# Altium footprint library eLIB.PcbLib: 206 footprints (part 13 of 13)
Each footprint in its own frame and in the unit in brackets; x right, y up, seen from the top. Pads: shape width x height; smd on the part's side, far side on the other; paste and mask are expansions set on the pad; w line width, h text height; cw(c..) or ccw(c..) is an arc to the next point about the centre after c.
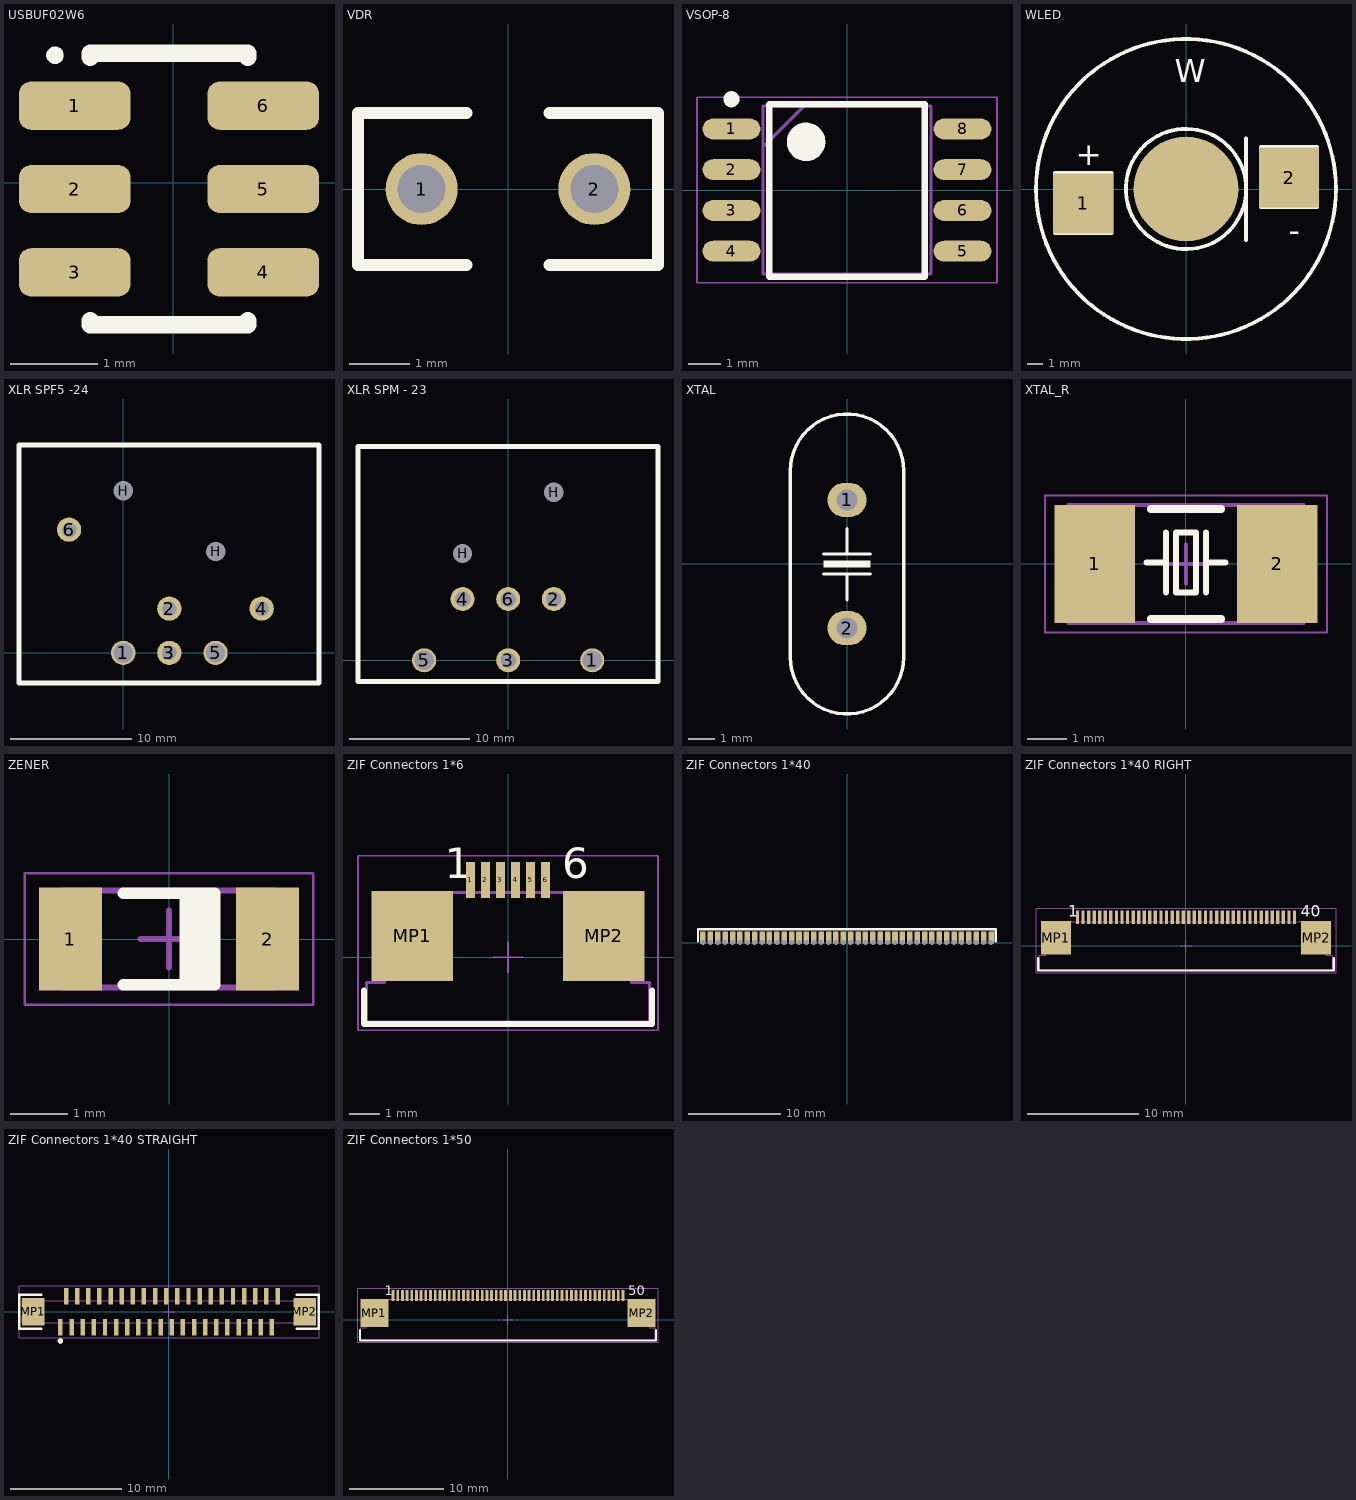
[diagram p12: the footprints below, top view; thin cyan lines are the x and y axes]

## USBUF02W6 [mm]
pads (6):
  rrect50% 1.27x0.55 smd paste+0.038 mask+0.038: 1(-1.124,0.877) 2(-1.124,-0.073) 3(-1.124,-1.023) 4(1.026,-1.023) 5(1.026,-0.073) 6(1.026,0.877)
Top Overlay:
  circle w0.1: c-1.349,1.452 r0.05
  lines w0.2: -0.949,-1.573 -0.949,-1.623 0.851,-1.623 0.851,-1.573 ; -0.949,1.427 -0.949,1.477 0.851,1.477 0.851,1.427
3D body "User Library-SOT23-6-2.STEP": height 1.45, standoff 0, extent -1.449,-1.523 1.351,1.377

## VDR [mm] "voltage depended resistor"
pads (2):
  round 1.2 hole 0.8: 1(-1.44,0) 2(1.44,0)
Top Overlay:
  lines w0.2: -0.692,-1.27 -2.5,-1.27 -2.5,1.27 -0.692,1.27 ; 0.692,-1.27 2.5,-1.27 2.5,1.27 0.692,1.27

## VSOP-8 [mm] "128Mbit NOR flash SPI"
pads (8):
  oval 1.8x0.65 smd: 1(-3.6,1.905) 2(-3.6,0.635) 3(-3.6,-0.635) 4(-3.6,-1.905) 5(3.6,-1.905) 6(3.6,-0.635) 7(3.6,0.635) 8(3.6,1.905)
Top Overlay:
  circle w0.25: c-3.6,2.83 r0.125
  circle w0.6: c-1.275,1.5 r0.3
  lines w0.2: -2.425,-2.7 -2.425,2.67 2.425,2.67 2.425,-2.7 -2.425,-2.7
Mechanical 13:
  lines w0.1: -2.615,1.345 -1.345,2.615 ; -2.615,-2.615 -2.615,2.615 2.615,2.615 2.615,-2.615 -2.615,-2.615
Mechanical 15:
  lines w0.05: -4.675,-2.89 -4.675,2.89 4.675,2.89 4.675,-2.89 -4.675,-2.89
3D body "User Library-W25Q128.STEP": height 1.9, standoff 0, extent -4.047,-2.745 4.087,2.745

## WLED [mm]
pads (3):
  rect 4x4 smd: 1(-6.858,-0.965) 2(6.883,0.762)
  round 7 smd: ""(0,0)
Top Overlay:
  circle w0.254: c0,0 r10.008
  circle w0.254: c0,0 r4.013
  lines w0.254: 4.013,-3.404 4.013,3.383 ; -8.738,-2.946 -4.978,-2.946 -4.978,1.067 -8.738,1.067 -8.738,-2.946 ; 5.004,-1.219 8.763,-1.219 8.763,2.794 5.004,2.794 5.004,-1.219
  text "W" at -0.762,7.112 h1.52
  text "+" at -7.366,1.575 h1.52
  text "-" at 6.858,-3.505 h1.52
3D body "SW3dPS-Power LED2.STEP": height 5.55, standoff 0, extent -7.23,-4.05 7.27,3.95

## XLR SPF5 -24 [mm] "ZWEE female 5 pole XLR"
pads (9):
  round 2 hole 1.6: 1(0,0) 5(7.6,0)
  round 2 hole 1.2: 2(3.8,3.65) 3(3.8,0) 3(3.8,0) 4(11.4,3.65) 6(-4.46,10.15)
  round 1.5 hole 1.6: H(0,13.35) H(7.62,8.35)
Top Overlay:
  lines w0.4: -8.58,-2.48 -8.58,17.12 16.12,17.12 16.12,-2.48 -8.58,-2.48

## XLR SPM - 23 [mm] "ZWEE male 5 pole XLR"
pads (8):
  round 2 hole 1.6: 1(7,0) 5(-7,0)
  round 2 hole 1.3: 2(3.8,5.1) 3(0,0) 4(-3.8,5.1) 6(0,5.1)
  round 1.5 hole 1.6: H(-3.8,8.9) H(3.8,14)
Top Overlay:
  lines w0.4: -12.51,-1.78 -12.51,17.82 12.48,17.82 12.48,-1.78 -12.51,-1.78

## XTAL [mm]
pads (2):
  oval 1.5x1.3 hole 0.8: 1(0,2.44) 2(0,-2.44)
Top Overlay:
  region: -0.889,0.127 -0.889,-0.127 0.889,-0.127 0.889,0.127
  lines w0.127: -0.889,-0.381 0.889,-0.381 ; -0.889,0.381 0.889,0.381 ; 0,-1.372 0,-0.381 ; 0,0.381 0,1.346 ; -2.159,-3.556 ccw(c0,-3.556) 2.159,-3.556 2.159,3.556 ccw(c0,3.556) -2.159,3.556 -2.159,-3.556
3D body "Crystal-3.8mm.STEP": height 3.56, standoff -2, extent -2.25,-5.75 2.25,5.75

## XTAL_R [mm]
pads (2):
  rect 2.05x3 smd: 1(-2.325,0) 2(2.325,0)
Top Overlay:
  lines w0.152: -1.008,0.039 -0.508,0.039 ; -0.508,-0.723 -0.508,0.801 ; 0.508,-0.723 0.508,0.801 ; 0.508,0.039 1.008,0.039 ; -0.25,-0.723 -0.25,0.801 0.25,0.801 0.25,-0.723 -0.25,-0.723
  lines w0.2: -0.9,-1.4 0.9,-1.4 ; -0.9,1.4 0.9,1.4
Mechanical 13:
  lines w0.1: -3,-1.5 -3,1.5 3,1.5 3,-1.5 -3,-1.5
Mechanical 15:
  lines w0.05: -3.6,-1.75 -3.6,1.75 3.6,1.75 3.6,-1.75 -3.6,-1.75
  lines w0.1: -0.5,0 0.5,0 ; 0,-0.5 0,0.5
3D body: height 1.1, standoff 0, extent -1.9,-1.5 1.9,1.5
3D body: height 1.1, standoff 0, extent -3,-1.5 -1.9,1.5
3D body: height 1.1, standoff 0, extent 1.9,-1.5 3,1.5

## ZENER [mm] "MELF Diode, 2-Leads, Body 3.50x1.47mm, IPC Medium Density"
height 1.7
pads (2):
  rect 1.1x1.8 smd: 1(-1.725,0) 2(1.725,0)
Top Overlay:
  rectangle: 0.18,-0.87 0.73,0.73
  lines w0.2: -0.8,-0.8 0.8,-0.8 0.8,0.8 -0.8,0.8
Mechanical 13:
  lines w0.1: -1.855,-0.85 -1.855,0.85 1.855,0.85 1.855,-0.85 -1.855,-0.85
Mechanical 15:
  lines w0.05: -2.525,-1.15 -2.525,1.15 2.525,1.15 2.525,-1.15 -2.525,-1.15
  lines w0.1: -0.5,0 0.5,0 ; 0,-0.5 0,0.5
3D body: height 1.69, standoff 0, extent -1.855,-0.85 -1.485,0.847
3D body: height 1.68, standoff 0.04, extent -0.885,-0.821 -0.285,0.818
3D body: height 1.68, standoff 0.04, extent -1.485,-0.82 1.485,0.817
3D body: height 1.69, standoff 0, extent 1.485,-0.85 1.855,0.847

## ZIF Connectors 1*6 [mm] "ZIF Connectors, Horizontal, Top Contact, pitch 0.5mm, 6p"
height 2.25
pads (8):
  rect 0.3x1.2 smd: 1(-1.25,2.56) 2(-0.75,2.56) 3(-0.25,2.56) 4(0.25,2.56) 5(0.75,2.56) 6(1.25,2.56)
  rect 2.7x3 smd: MP1(-3.18,0.7) MP2(3.18,0.7)
Top Overlay:
  lines w0.2: -4.775,-1.1 -4.775,-2.225 4.775,-2.225 4.775,-1.1
  text "1" at -2.1,2.61 h1.02
  text "6" at 1.8,2.61 h1.02
Mechanical 13:
  lines w0.1: -4.7,-2.15 4.7,-2.15 4.7,-0.85 4.1,-0.85 4.1,2.15 -4.1,2.15 -4.1,-0.85 -4.7,-0.85 -4.7,-2.15
Mechanical 15:
  lines w0.05: -0.5,0 0.5,0 ; 0,-0.5 0,0.5 ; -4.975,-2.425 4.975,-2.425 4.975,3.36 -4.975,3.36 -4.975,-2.425
3D body "68710614022.stp": height 2.1, standoff 0, extent -4.7,-2.15 4.7,2.95

## ZIF Connectors 1*40 [mm]
pads (40):
  rect 0.6x1.3 hole 0.55 copper offset 0,0.55: 1(-15.642,0) 2(-14.84,0) 3(-14.038,0) 4(-13.236,0) 5(-12.434,0) 6(-11.632,0) 7(-10.829,0) 8(-10.027,0) 9(-9.225,0) 10(-8.423,0) 11(-7.621,0) 12(-6.819,0) 13(-6.016,0) 14(-5.214,0) 15(-4.412,0) 16(-3.61,0) 17(-2.808,0) 18(-2.005,0) 19(-1.203,0) 20(-0.401,0) 21(0.401,0) 22(1.203,0) 23(2.005,0) 24(2.808,0) 25(3.61,0) 26(4.412,0) 27(5.214,0) 28(6.016,0) 29(6.819,0) 30(7.621,0) 31(8.423,0) 32(9.225,0) 33(10.027,0) 34(10.829,0) 35(11.632,0) 36(12.434,0) 37(13.236,0) 38(14.038,0) 39(14.84,0) 40(15.642,0)
Top Overlay:
  lines w0.254: -16.178,0.13 -16.178,1.44 15.97,1.44 16.17,1.44 16.17,0.13

## ZIF Connectors 1*40 RIGHT [mm] "ZIF Connectors, Horizontal, Bottom Contact, pitch 0.5mm, 40p"
height 2.25
pads (42):
  rect 0.3x1.2 smd: 1(-9.75,2.56) 2(-9.25,2.56) 3(-8.75,2.56) 4(-8.25,2.56) 5(-7.75,2.56) 6(-7.25,2.56) 7(-6.75,2.56) 8(-6.25,2.56) 9(-5.75,2.56) 10(-5.25,2.56) 11(-4.75,2.56) 12(-4.25,2.56) 13(-3.75,2.56) 14(-3.25,2.56) 15(-2.75,2.56) 16(-2.25,2.56) 17(-1.75,2.56) 18(-1.25,2.56) 19(-0.75,2.56) 20(-0.25,2.56) 21(0.25,2.56) 22(0.75,2.56) 23(1.25,2.56) 24(1.75,2.56) 25(2.25,2.56) 26(2.75,2.56) 27(3.25,2.56) 28(3.75,2.56) 29(4.25,2.56) 30(4.75,2.56) 31(5.25,2.56) 32(5.75,2.56) 33(6.25,2.56) 34(6.75,2.56) 35(7.25,2.56) 36(7.75,2.56) 37(8.25,2.56) 38(8.75,2.56) 39(9.25,2.56) 40(9.75,2.56)
  rect 2.7x3 smd: MP1(-11.68,0.7) MP2(11.68,0.7)
Top Overlay:
  lines w0.2: -13.275,-1.125 -13.275,-2.225 13.275,-2.225 13.275,-1.125
  text "1" at -10.6,2.61 h1.02
  text "40" at 10.3,2.61 h1.02
Mechanical 13:
  lines w0.1: -13.2,-2.15 -13.2,-0.85 -12.6,-0.85 -12.6,2.15 12.6,2.15 12.6,-0.85 13.2,-0.85 13.2,-2.15 -13.2,-2.15
Mechanical 15:
  lines w0.05: -0.5,0 0.5,0 ; 0,-0.5 0,0.5 ; -13.475,-2.425 13.475,-2.425 13.475,3.36 -13.475,3.36 -13.475,-2.425
3D body "68714014522.stp": height 2.1, standoff 0, extent -13.2,-2.15 13.2,2.95

## ZIF Connectors 1*40 STRAIGHT [mm] "PFC Connectors, Vertical, pitch 0.5mm, 40p"
height 4.5
pads (42):
  rect 0.4x1.5 smd: 1(-9.75,-1.4) 2(-9.25,1.4) 3(-8.75,-1.4) 4(-8.25,1.4) 5(-7.75,-1.4) 6(-7.25,1.4) 7(-6.75,-1.4) 8(-6.25,1.4) 9(-5.75,-1.4) 10(-5.25,1.4) 11(-4.75,-1.4) 12(-4.25,1.4) 13(-3.75,-1.4) 14(-3.25,1.4) 15(-2.75,-1.4) 16(-2.25,1.4) 17(-1.75,-1.4) 18(-1.25,1.4) 19(-0.75,-1.4) 20(-0.25,1.4) 21(0.25,-1.4) 22(0.75,1.4) 23(1.25,-1.4) 24(1.75,1.4) 25(2.25,-1.4) 26(2.75,1.4) 27(3.25,-1.4) 28(3.75,1.4) 29(4.25,-1.4) 30(4.75,1.4) 31(5.25,-1.4) 32(5.75,1.4) 33(6.25,-1.4) 34(6.75,1.4) 35(7.25,-1.4) 36(7.75,1.4) 37(8.25,-1.4) 38(8.75,1.4) 39(9.25,-1.4) 40(9.75,1.4)
  rect 2x2.5 smd: MP1(-12.192,0) MP2(12.192,0)
Top Overlay:
  circle w0.25: c-9.75,-2.625 r0.125
  lines w0.2: -11.45,-1.524 -13.462,-1.524 -13.462,1.524 -11.45,1.524 ; 11.45,-1.524 13.462,-1.524 13.462,1.524 11.45,1.524
Mechanical 13:
  lines w0.1: -13.2,-1 -13.2,1 13.2,1 13.2,-1 -13.2,-1
Mechanical 15:
  lines w0.05: -0.5,0 0.5,0 ; 0,-0.5 0,0.5 ; -13.475,-2.35 -13.475,2.35 13.475,2.35 13.475,-2.35 -13.475,-2.35
3D body "687340124422.stp": height 4.92, standoff 0.02, extent -13.2,-1.75 13.2,1.75

## ZIF Connectors 1*50 [mm] "ZIF Connectors, Horizontal, Top Contact, pitch 0.5mm, 50p"
height 2.25
pads (52):
  rect 0.3x1.2 smd: 1(-12.25,2.56) 2(-11.75,2.56) 3(-11.25,2.56) 4(-10.75,2.56) 5(-10.25,2.56) 6(-9.75,2.56) 7(-9.25,2.56) 8(-8.75,2.56) 9(-8.25,2.56) 10(-7.75,2.56) 11(-7.25,2.56) 12(-6.75,2.56) 13(-6.25,2.56) 14(-5.75,2.56) 15(-5.25,2.56) 16(-4.75,2.56) 17(-4.25,2.56) 18(-3.75,2.56) 19(-3.25,2.56) 20(-2.75,2.56) 21(-2.25,2.56) 22(-1.75,2.56) 23(-1.25,2.56) 24(-0.75,2.56) 25(-0.25,2.56) 26(0.25,2.56) 27(0.75,2.56) 28(1.25,2.56) 29(1.75,2.56) 30(2.25,2.56) 31(2.75,2.56) 32(3.25,2.56) 33(3.75,2.56) 34(4.25,2.56) 35(4.75,2.56) 36(5.25,2.56) 37(5.75,2.56) 38(6.25,2.56) 39(6.75,2.56) 40(7.25,2.56) 41(7.75,2.56) 42(8.25,2.56) 43(8.75,2.56) 44(9.25,2.56) 45(9.75,2.56) 46(10.25,2.56) 47(10.75,2.56) 48(11.25,2.56) 49(11.75,2.56) 50(12.25,2.56)
  rect 3x3 smd: MP1(-14.22,0.7) MP2(14.22,0.7)
Top Overlay:
  lines w0.2: -15.775,-1.1 -15.775,-2.225 15.775,-2.225 15.775,-1.1
  text "50" at 12.8,2.61 h1.02
  text "1" at -13.1,2.61 h1.02
Mechanical 13:
  lines w0.1: -15.7,-2.15 -15.7,-0.85 -15.1,-0.85 -15.1,2.15 15.1,2.15 15.1,-0.85 15.7,-0.85 15.7,-2.15 -15.7,-2.15
Mechanical 15:
  lines w0.05: -0.5,0 0.5,0 ; 0,-0.5 0,0.5 ; -15.975,-2.425 -15.975,3.36 15.975,3.36 15.975,-2.425 -15.975,-2.425
3D body "68715014022.stp": height 2.1, standoff 0, extent -15.7,-2.15 15.7,2.95